# Altium schematic symbol library jlcpcb_2025_04_capacitors_extended_0603.schlib: 3668 symbols (part 6 of 20)
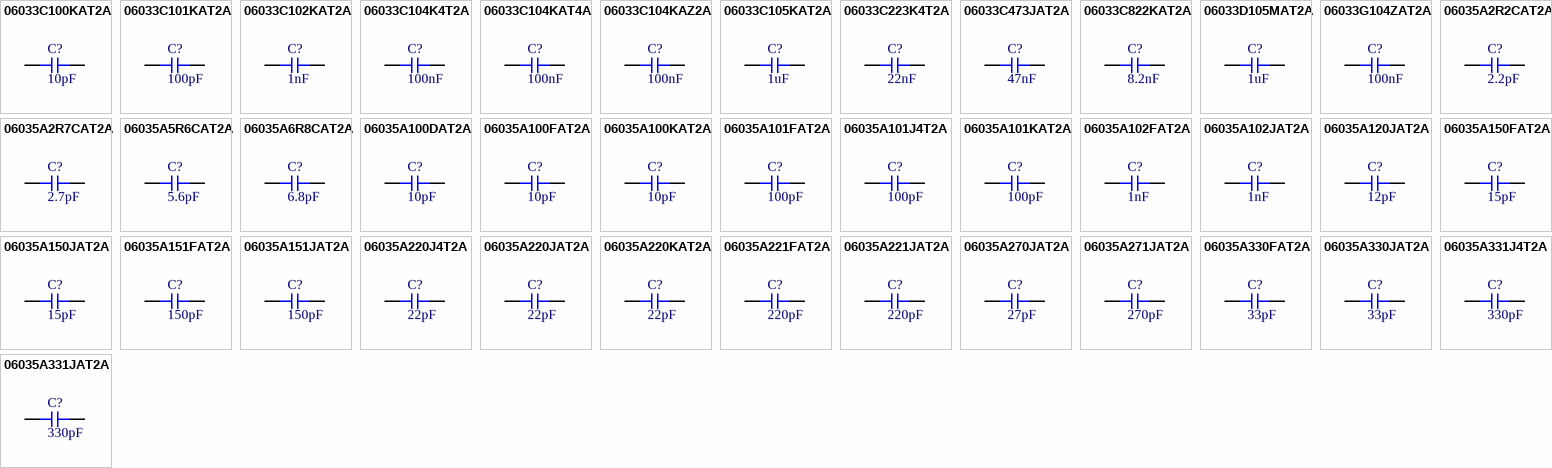
[diagram p96: symbols 06033C100KAT2A to 06035A331JAT2A]

## 06035A220JAT2A
designator C?  Capacitance: 22pF  (hidden comment: *)
Capacitor, Ceramic (MLCC), 22pF, ±5%, 50V, C0G, ±5%, SMD 0603; Manufacturer: Kyocera AVX; Manufacturer Part Number: 06035A220JAT2A; Package Size: 0603; JLCPCB Basic Part: No; JLCPCB Part Number: C2913779; Supplier 1: LCSC; Category: Capacitors - MLCC; Supplier Part Number 1: C2913779; Tolerance: ±5%; Voltage Rating: 50V; Temperature Coefficient: C0G; RoHS: Yes; ComponentLink1Description: Datasheet; ComponentLink1URL: https://wmsc.lcsc.com/wmsc/upload/file/pdf/v2/lcsc/2111191730_Kyocera-AVX-06035A220JAT2A_C2913779.pdf; ComponentLink2Description: JLCPCB Part URL; ComponentLink2URL: https://jlcpcb.com/partdetail/C2913779; ComponentLink3Description: LCSC Part URL; ComponentLink3URL: https://lcsc.com/product-detail/Multilayer-Ceramic-Capacitors-MLCC---SMD-SMT_Kyocera-AVX-Kyocera-AVX-06035A220JAT2A_C2913779.html
footprint CAP-0603 (0603 (1608M) Capacitor)
pins: 1, 2

## 06035A220KAT2A
designator C?  Capacitance: 22pF  (hidden comment: *)
Capacitor, Ceramic (MLCC), 22pF, ±10%, 50V, C0G, ±10%, SMD 0603; Manufacturer: AVX; Manufacturer Part Number: 06035A220KAT2A; Package Size: 0603; JLCPCB Basic Part: No; JLCPCB Part Number: C597147; Supplier 1: LCSC; Category: Capacitors - MLCC; Supplier Part Number 1: C597147; Tolerance: ±10%; Voltage Rating: 50V; Temperature Coefficient: C0G; RoHS: Yes; ComponentLink1Description: Datasheet; ComponentLink1URL: https://wmsc.lcsc.com/wmsc/upload/file/pdf/v2/lcsc/2304140030_Kyocera-AVX-06035A220KAT2A_C597147.pdf; ComponentLink2Description: JLCPCB Part URL; ComponentLink2URL: https://jlcpcb.com/partdetail/C597147; ComponentLink3Description: LCSC Part URL; ComponentLink3URL: https://lcsc.com/product-detail/Multilayer-Ceramic-Capacitors-MLCC---SMD-SMT_Kyocera-AVX-Kyocera-AVX-06035A220KAT2A_C597147.html
footprint CAP-0603 (0603 (1608M) Capacitor)
pins: 1, 2

## 06035A221FAT2A
designator C?  Capacitance: 220pF  (hidden comment: *)
Capacitor, Ceramic (MLCC), 220pF, ±1%, 50V, C0G, ±1%, SMD 0603; Manufacturer: AVX; Manufacturer Part Number: 06035A221FAT2A; Package Size: 0603; JLCPCB Basic Part: No; JLCPCB Part Number: C597148; Supplier 1: LCSC; Category: Capacitors - MLCC; Supplier Part Number 1: C597148; Tolerance: ±1%; Voltage Rating: 50V; Temperature Coefficient: C0G; RoHS: Yes; ComponentLink1Description: Datasheet; ComponentLink1URL: https://wmsc.lcsc.com/wmsc/upload/file/pdf/v2/lcsc/2304140030_Kyocera-AVX-06035A221FAT2A_C597148.pdf; ComponentLink2Description: JLCPCB Part URL; ComponentLink2URL: https://jlcpcb.com/partdetail/C597148; ComponentLink3Description: LCSC Part URL; ComponentLink3URL: https://lcsc.com/product-detail/Multilayer-Ceramic-Capacitors-MLCC---SMD-SMT_Kyocera-AVX-Kyocera-AVX-06035A221FAT2A_C597148.html
footprint CAP-0603 (0603 (1608M) Capacitor)
pins: 1, 2

## 06035A221JAT2A
designator C?  Capacitance: 220pF  (hidden comment: *)
Capacitor, Ceramic (MLCC), 220pF, ±5%, 50V, C0G, ±5%, SMD 0603; Manufacturer: AVX; Manufacturer Part Number: 06035A221JAT2A; Package Size: 0603; JLCPCB Basic Part: No; JLCPCB Part Number: C597151; Supplier 1: LCSC; Category: Capacitors - MLCC; Supplier Part Number 1: C597151; Tolerance: ±5%; Voltage Rating: 50V; Temperature Coefficient: C0G; RoHS: Yes; ComponentLink1Description: Datasheet; ComponentLink1URL: https://wmsc.lcsc.com/wmsc/upload/file/pdf/v2/lcsc/2304140030_Kyocera-AVX-06035A221JAT2A_C597151.pdf; ComponentLink2Description: JLCPCB Part URL; ComponentLink2URL: https://jlcpcb.com/partdetail/C597151; ComponentLink3Description: LCSC Part URL; ComponentLink3URL: https://lcsc.com/product-detail/Multilayer-Ceramic-Capacitors-MLCC---SMD-SMT_Kyocera-AVX-Kyocera-AVX-06035A221JAT2A_C597151.html
footprint CAP-0603 (0603 (1608M) Capacitor)
pins: 1, 2

## 06035A270JAT2A
designator C?  Capacitance: 27pF  (hidden comment: *)
Capacitor, Ceramic (MLCC), 27pF, ±5%, 50V, C0G, ±5%, SMD 0603; Manufacturer: AVX; Manufacturer Part Number: 06035A270JAT2A; Package Size: 0603; JLCPCB Basic Part: No; JLCPCB Part Number: C597154; Supplier 1: LCSC; Category: Capacitors - MLCC; Supplier Part Number 1: C597154; Tolerance: ±5%; Voltage Rating: 50V; Temperature Coefficient: C0G; RoHS: Yes; ComponentLink1Description: Datasheet; ComponentLink1URL: https://wmsc.lcsc.com/wmsc/upload/file/pdf/v2/lcsc/2304140030_Kyocera-AVX-06035A270JAT2A_C597154.pdf; ComponentLink2Description: JLCPCB Part URL; ComponentLink2URL: https://jlcpcb.com/partdetail/C597154; ComponentLink3Description: LCSC Part URL; ComponentLink3URL: https://lcsc.com/product-detail/Multilayer-Ceramic-Capacitors-MLCC---SMD-SMT_Kyocera-AVX-Kyocera-AVX-06035A270JAT2A_C597154.html
footprint CAP-0603 (0603 (1608M) Capacitor)
pins: 1, 2

## 06035A271JAT2A
designator C?  Capacitance: 270pF  (hidden comment: *)
Capacitor, Ceramic (MLCC), 270pF, ±5%, 50V, C0G, ±5%, SMD 0603; Manufacturer: AVX; Manufacturer Part Number: 06035A271JAT2A; Package Size: 0603; JLCPCB Basic Part: No; JLCPCB Part Number: C597155; Supplier 1: LCSC; Category: Capacitors - MLCC; Supplier Part Number 1: C597155; Tolerance: ±5%; Voltage Rating: 50V; Temperature Coefficient: C0G; RoHS: Yes; ComponentLink1Description: Datasheet; ComponentLink1URL: https://wmsc.lcsc.com/wmsc/upload/file/pdf/v2/lcsc/2304140030_Kyocera-AVX-06035A271JAT2A_C597155.pdf; ComponentLink2Description: JLCPCB Part URL; ComponentLink2URL: https://jlcpcb.com/partdetail/C597155; ComponentLink3Description: LCSC Part URL; ComponentLink3URL: https://lcsc.com/product-detail/Multilayer-Ceramic-Capacitors-MLCC---SMD-SMT_Kyocera-AVX-Kyocera-AVX-06035A271JAT2A_C597155.html
footprint CAP-0603 (0603 (1608M) Capacitor)
pins: 1, 2

## 06035A330FAT2A
designator C?  Capacitance: 33pF  (hidden comment: *)
Capacitor, Ceramic (MLCC), 33pF, ±1%, 50V, C0G, ±1%, SMD 0603; Manufacturer: AVX; Manufacturer Part Number: 06035A330FAT2A; Package Size: 0603; JLCPCB Basic Part: No; JLCPCB Part Number: C597158; Supplier 1: LCSC; Category: Capacitors - MLCC; Supplier Part Number 1: C597158; Tolerance: ±1%; Voltage Rating: 50V; Temperature Coefficient: C0G; RoHS: Yes; ComponentLink1Description: Datasheet; ComponentLink1URL: https://wmsc.lcsc.com/wmsc/upload/file/pdf/v2/lcsc/2304140030_Kyocera-AVX-06035A330FAT2A_C597158.pdf; ComponentLink2Description: JLCPCB Part URL; ComponentLink2URL: https://jlcpcb.com/partdetail/C597158; ComponentLink3Description: LCSC Part URL; ComponentLink3URL: https://lcsc.com/product-detail/Multilayer-Ceramic-Capacitors-MLCC---SMD-SMT_Kyocera-AVX-Kyocera-AVX-06035A330FAT2A_C597158.html
footprint CAP-0603 (0603 (1608M) Capacitor)
pins: 1, 2

## 06035A330JAT2A
designator C?  Capacitance: 33pF  (hidden comment: *)
Capacitor, Ceramic (MLCC), 33pF, ±5%, 50V, C0G, ±5%, SMD 0603; Manufacturer: Kyocera AVX; Manufacturer Part Number: 06035A330JAT2A; Package Size: 0603; JLCPCB Basic Part: No; JLCPCB Part Number: C2168738; Supplier 1: LCSC; Category: Capacitors - MLCC; Supplier Part Number 1: C2168738; Tolerance: ±5%; Voltage Rating: 50V; Temperature Coefficient: C0G; RoHS: Yes; ComponentLink1Description: Datasheet; ComponentLink1URL: https://wmsc.lcsc.com/wmsc/upload/file/pdf/v2/lcsc/2304140030_Kyocera-AVX-06035A330JAT2A_C2168738.pdf; ComponentLink2Description: JLCPCB Part URL; ComponentLink2URL: https://jlcpcb.com/partdetail/C2168738; ComponentLink3Description: LCSC Part URL; ComponentLink3URL: https://lcsc.com/product-detail/Multilayer-Ceramic-Capacitors-MLCC---SMD-SMT_Kyocera-AVX-Kyocera-AVX-06035A330JAT2A_C2168738.html
footprint CAP-0603 (0603 (1608M) Capacitor)
pins: 1, 2

## 06035A331J4T2A
designator C?  Capacitance: 330pF  (hidden comment: *)
Capacitor, Ceramic (MLCC), 330pF, ±5%, 50V, C0G, ±5%, SMD 0603; Manufacturer: Kyocera AVX; Manufacturer Part Number: 06035A331J4T2A; Package Size: 0603; JLCPCB Basic Part: No; JLCPCB Part Number: C779989; Supplier 1: LCSC; Category: Capacitors - MLCC; Supplier Part Number 1: C779989; Tolerance: ±5%; Voltage Rating: 50V; Temperature Coefficient: C0G; RoHS: Yes; ComponentLink1Description: Datasheet; ComponentLink1URL: https://wmsc.lcsc.com/wmsc/upload/file/pdf/v2/lcsc/2304140030_Kyocera-AVX-06035A331J4T2A_C779989.pdf; ComponentLink2Description: JLCPCB Part URL; ComponentLink2URL: https://jlcpcb.com/partdetail/C779989; ComponentLink3Description: LCSC Part URL; ComponentLink3URL: https://lcsc.com/product-detail/Multilayer-Ceramic-Capacitors-MLCC---SMD-SMT_Kyocera-AVX-Kyocera-AVX-06035A331J4T2A_C779989.html
footprint CAP-0603 (0603 (1608M) Capacitor)
pins: 1, 2

## 06035A331JAT2A
designator C?  Capacitance: 330pF  (hidden comment: *)
Capacitor, Ceramic (MLCC), 330pF, ±5%, 50V, C0G, ±5%, SMD 0603; Manufacturer: AVX; Manufacturer Part Number: 06035A331JAT2A; Package Size: 0603; JLCPCB Basic Part: No; JLCPCB Part Number: C597160; Supplier 1: LCSC; Category: Capacitors - MLCC; Supplier Part Number 1: C597160; Tolerance: ±5%; Voltage Rating: 50V; Temperature Coefficient: C0G; RoHS: Yes; ComponentLink1Description: Datasheet; ComponentLink1URL: https://wmsc.lcsc.com/wmsc/upload/file/pdf/v2/lcsc/2304140030_Kyocera-AVX-06035A331JAT2A_C597160.pdf; ComponentLink2Description: JLCPCB Part URL; ComponentLink2URL: https://jlcpcb.com/partdetail/C597160; ComponentLink3Description: LCSC Part URL; ComponentLink3URL: https://lcsc.com/product-detail/Multilayer-Ceramic-Capacitors-MLCC---SMD-SMT_Kyocera-AVX-Kyocera-AVX-06035A331JAT2A_C597160.html
footprint CAP-0603 (0603 (1608M) Capacitor)
pins: 1, 2

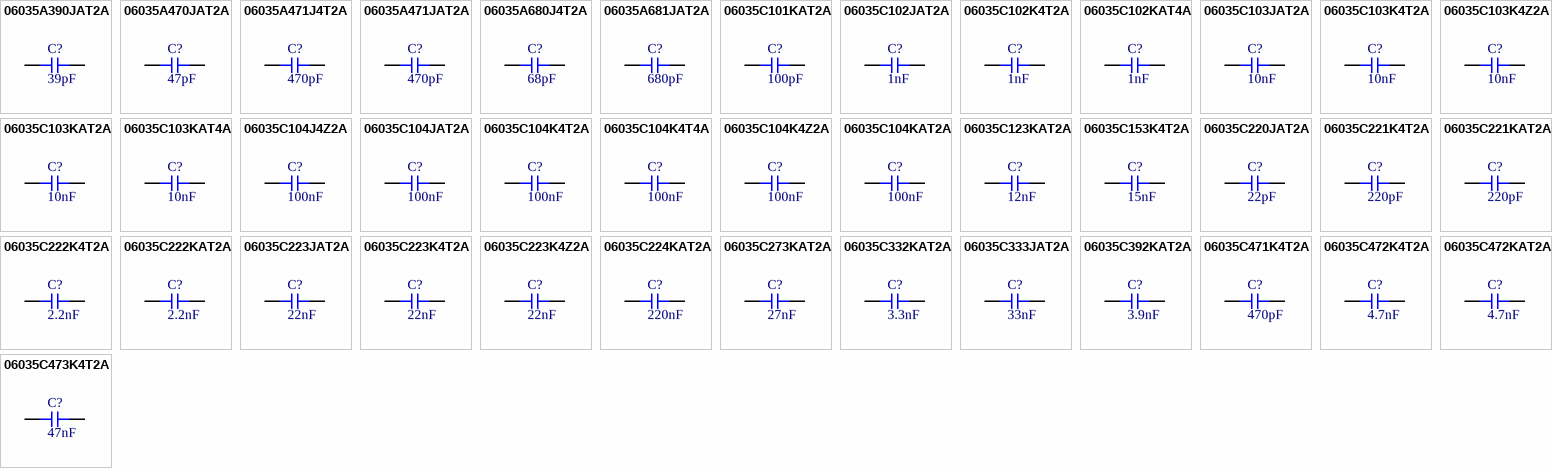
[diagram p23: symbols 06035A390JAT2A to 06035C473K4T2A]

## 06035A390JAT2A
designator C?  Capacitance: 39pF  (hidden comment: *)
Capacitor, Ceramic (MLCC), 39pF, ±5%, 50V, C0G, ±5%, SMD 0603; Manufacturer: AVX; Manufacturer Part Number: 06035A390JAT2A; Package Size: 0603; JLCPCB Basic Part: No; JLCPCB Part Number: C597161; Supplier 1: LCSC; Category: Capacitors - MLCC; Supplier Part Number 1: C597161; Tolerance: ±5%; Voltage Rating: 50V; Temperature Coefficient: C0G; RoHS: Yes; ComponentLink1Description: Datasheet; ComponentLink1URL: https://wmsc.lcsc.com/wmsc/upload/file/pdf/v2/lcsc/2304140030_Kyocera-AVX-06035A390JAT2A_C597161.pdf; ComponentLink2Description: JLCPCB Part URL; ComponentLink2URL: https://jlcpcb.com/partdetail/C597161; ComponentLink3Description: LCSC Part URL; ComponentLink3URL: https://lcsc.com/product-detail/Multilayer-Ceramic-Capacitors-MLCC---SMD-SMT_Kyocera-AVX-Kyocera-AVX-06035A390JAT2A_C597161.html
footprint CAP-0603 (0603 (1608M) Capacitor)
pins: 1, 2

## 06035A470JAT2A
designator C?  Capacitance: 47pF  (hidden comment: *)
Capacitor, Ceramic (MLCC), 47pF, ±5%, 50V, C0G, ±5%, SMD 0603; Manufacturer: AVX; Manufacturer Part Number: 06035A470JAT2A; Package Size: 0603; JLCPCB Basic Part: No; JLCPCB Part Number: C513324; Supplier 1: LCSC; Category: Capacitors - MLCC; Supplier Part Number 1: C513324; Tolerance: ±5%; Voltage Rating: 50V; Temperature Coefficient: C0G; RoHS: Yes; ComponentLink1Description: Datasheet; ComponentLink1URL: https://wmsc.lcsc.com/wmsc/upload/file/pdf/v2/lcsc/2304140030_Kyocera-AVX-06035A470JAT2A_C513324.pdf; ComponentLink2Description: JLCPCB Part URL; ComponentLink2URL: https://jlcpcb.com/partdetail/C513324; ComponentLink3Description: LCSC Part URL; ComponentLink3URL: https://lcsc.com/product-detail/Multilayer-Ceramic-Capacitors-MLCC---SMD-SMT_Kyocera-AVX-Kyocera-AVX-06035A470JAT2A_C513324.html
footprint CAP-0603 (0603 (1608M) Capacitor)
pins: 1, 2

## 06035A471J4T2A
designator C?  Capacitance: 470pF  (hidden comment: *)
Capacitor, Ceramic (MLCC), 470pF, ±5%, 50V, C0G, ±5%, SMD 0603; Manufacturer: AVX; Manufacturer Part Number: 06035A471J4T2A; Package Size: 0603; JLCPCB Basic Part: No; JLCPCB Part Number: C597167; Supplier 1: LCSC; Category: Capacitors - MLCC; Supplier Part Number 1: C597167; Tolerance: ±5%; Voltage Rating: 50V; Temperature Coefficient: C0G; RoHS: Yes; ComponentLink1Description: Datasheet; ComponentLink1URL: https://wmsc.lcsc.com/wmsc/upload/file/pdf/v2/lcsc/2304140030_Kyocera-AVX-06035A471J4T2A_C597167.pdf; ComponentLink2Description: JLCPCB Part URL; ComponentLink2URL: https://jlcpcb.com/partdetail/C597167; ComponentLink3Description: LCSC Part URL; ComponentLink3URL: https://lcsc.com/product-detail/Multilayer-Ceramic-Capacitors-MLCC---SMD-SMT_Kyocera-AVX-Kyocera-AVX-06035A471J4T2A_C597167.html
footprint CAP-0603 (0603 (1608M) Capacitor)
pins: 1, 2

## 06035A471JAT2A
designator C?  Capacitance: 470pF  (hidden comment: *)
Capacitor, Ceramic (MLCC), 470pF, ±5%, 50V, C0G, ±5%, SMD 0603; Manufacturer: AVX; Manufacturer Part Number: 06035A471JAT2A; Package Size: 0603; JLCPCB Basic Part: No; JLCPCB Part Number: C597168; Supplier 1: LCSC; Category: Capacitors - MLCC; Supplier Part Number 1: C597168; Tolerance: ±5%; Voltage Rating: 50V; Temperature Coefficient: C0G; RoHS: Yes; ComponentLink1Description: Datasheet; ComponentLink1URL: https://wmsc.lcsc.com/wmsc/upload/file/pdf/v2/lcsc/2304140030_Kyocera-AVX-06035A471JAT2A_C597168.pdf; ComponentLink2Description: JLCPCB Part URL; ComponentLink2URL: https://jlcpcb.com/partdetail/C597168; ComponentLink3Description: LCSC Part URL; ComponentLink3URL: https://lcsc.com/product-detail/Multilayer-Ceramic-Capacitors-MLCC---SMD-SMT_Kyocera-AVX-Kyocera-AVX-06035A471JAT2A_C597168.html
footprint CAP-0603 (0603 (1608M) Capacitor)
pins: 1, 2

## 06035A680J4T2A
designator C?  Capacitance: 68pF  (hidden comment: *)
Capacitor, Ceramic (MLCC), 68pF, ±5%, 50V, C0G, ±5%, SMD 0603; Manufacturer: Kyocera AVX; Manufacturer Part Number: 06035A680J4T2A; Package Size: 0603; JLCPCB Basic Part: No; JLCPCB Part Number: C779986; Supplier 1: LCSC; Category: Capacitors - MLCC; Supplier Part Number 1: C779986; Tolerance: ±5%; Voltage Rating: 50V; Temperature Coefficient: C0G; RoHS: Yes; ComponentLink1Description: Datasheet; ComponentLink1URL: https://wmsc.lcsc.com/wmsc/upload/file/pdf/v2/lcsc/2304140030_Kyocera-AVX-06035A680J4T2A_C779986.pdf; ComponentLink2Description: JLCPCB Part URL; ComponentLink2URL: https://jlcpcb.com/partdetail/C779986; ComponentLink3Description: LCSC Part URL; ComponentLink3URL: https://lcsc.com/product-detail/Multilayer-Ceramic-Capacitors-MLCC---SMD-SMT_Kyocera-AVX-Kyocera-AVX-06035A680J4T2A_C779986.html
footprint CAP-0603 (0603 (1608M) Capacitor)
pins: 1, 2

## 06035A681JAT2A
designator C?  Capacitance: 680pF  (hidden comment: *)
Capacitor, Ceramic (MLCC), 680pF, ±5%, 50V, C0G, ±5%, SMD 0603; Manufacturer: AVX; Manufacturer Part Number: 06035A681JAT2A; Package Size: 0603; JLCPCB Basic Part: No; JLCPCB Part Number: C597175; Supplier 1: LCSC; Category: Capacitors - MLCC; Supplier Part Number 1: C597175; Tolerance: ±5%; Voltage Rating: 50V; Temperature Coefficient: C0G; RoHS: Yes; ComponentLink1Description: Datasheet; ComponentLink1URL: https://wmsc.lcsc.com/wmsc/upload/file/pdf/v2/lcsc/2304140030_Kyocera-AVX-06035A681JAT2A_C597175.pdf; ComponentLink2Description: JLCPCB Part URL; ComponentLink2URL: https://jlcpcb.com/partdetail/C597175; ComponentLink3Description: LCSC Part URL; ComponentLink3URL: https://lcsc.com/product-detail/Multilayer-Ceramic-Capacitors-MLCC---SMD-SMT_Kyocera-AVX-Kyocera-AVX-06035A681JAT2A_C597175.html
footprint CAP-0603 (0603 (1608M) Capacitor)
pins: 1, 2

## 06035C101KAT2A
designator C?  Capacitance: 100pF  (hidden comment: *)
Capacitor, Ceramic (MLCC), 100pF, ±10%, 50V, X7R, ±10%, SMD 0603; Manufacturer: AVX; Manufacturer Part Number: 06035C101KAT2A; Package Size: 0603; JLCPCB Basic Part: No; JLCPCB Part Number: C597182; Supplier 1: LCSC; Category: Capacitors - MLCC; Supplier Part Number 1: C597182; Tolerance: ±10%; Voltage Rating: 50V; Temperature Coefficient: X7R; RoHS: Yes; ComponentLink1Description: Datasheet; ComponentLink1URL: https://wmsc.lcsc.com/wmsc/upload/file/pdf/v2/lcsc/2304140030_Kyocera-AVX-06035C101KAT2A_C597182.pdf; ComponentLink2Description: JLCPCB Part URL; ComponentLink2URL: https://jlcpcb.com/partdetail/C597182; ComponentLink3Description: LCSC Part URL; ComponentLink3URL: https://lcsc.com/product-detail/Multilayer-Ceramic-Capacitors-MLCC---SMD-SMT_Kyocera-AVX-Kyocera-AVX-06035C101KAT2A_C597182.html
footprint CAP-0603 (0603 (1608M) Capacitor)
pins: 1, 2

## 06035C102JAT2A
designator C?  Capacitance: 1nF  (hidden comment: *)
Capacitor, Ceramic (MLCC), 1nF, ±5%, 50V, X7R, ±5%, SMD 0603; Manufacturer: AVX; Manufacturer Part Number: 06035C102JAT2A; Package Size: 0603; JLCPCB Basic Part: No; JLCPCB Part Number: C597183; Supplier 1: LCSC; Category: Capacitors - MLCC; Supplier Part Number 1: C597183; Tolerance: ±5%; Voltage Rating: 50V; Temperature Coefficient: X7R; RoHS: Yes; ComponentLink1Description: Datasheet; ComponentLink1URL: https://wmsc.lcsc.com/wmsc/upload/file/pdf/v2/lcsc/2304140030_Kyocera-AVX-06035C102JAT2A_C597183.pdf; ComponentLink2Description: JLCPCB Part URL; ComponentLink2URL: https://jlcpcb.com/partdetail/C597183; ComponentLink3Description: LCSC Part URL; ComponentLink3URL: https://lcsc.com/product-detail/Multilayer-Ceramic-Capacitors-MLCC---SMD-SMT_Kyocera-AVX-Kyocera-AVX-06035C102JAT2A_C597183.html
footprint CAP-0603 (0603 (1608M) Capacitor)
pins: 1, 2

## 06035C102K4T2A
designator C?  Capacitance: 1nF  (hidden comment: *)
Capacitor, Ceramic (MLCC), 1nF, ±10%, 50V, X7R, ±10%, SMD 0603; Manufacturer: AVX; Manufacturer Part Number: 06035C102K4T2A; Package Size: 0603; JLCPCB Basic Part: No; JLCPCB Part Number: C779969; Supplier 1: LCSC; Category: Capacitors - MLCC; Supplier Part Number 1: C779969; Tolerance: ±10%; Voltage Rating: 50V; Temperature Coefficient: X7R; RoHS: Yes; ComponentLink1Description: Datasheet; ComponentLink1URL: https://wmsc.lcsc.com/wmsc/upload/file/pdf/v2/lcsc/2304140030_Kyocera-AVX-06035C102K4T2A_C779969.pdf; ComponentLink2Description: JLCPCB Part URL; ComponentLink2URL: https://jlcpcb.com/partdetail/C779969; ComponentLink3Description: LCSC Part URL; ComponentLink3URL: https://lcsc.com/product-detail/Multilayer-Ceramic-Capacitors-MLCC---SMD-SMT_Kyocera-AVX-Kyocera-AVX-06035C102K4T2A_C779969.html
footprint CAP-0603 (0603 (1608M) Capacitor)
pins: 1, 2

## 06035C102KAT4A
designator C?  Capacitance: 1nF  (hidden comment: *)
Capacitor, Ceramic (MLCC), 1nF, ±10%, 50V, X7R, ±10%, SMD 0603; Manufacturer: AVX; Manufacturer Part Number: 06035C102KAT4A; Package Size: 0603; JLCPCB Basic Part: No; JLCPCB Part Number: C597186; Supplier 1: LCSC; Category: Capacitors - MLCC; Supplier Part Number 1: C597186; Tolerance: ±10%; Voltage Rating: 50V; Temperature Coefficient: X7R; RoHS: Yes; ComponentLink1Description: Datasheet; ComponentLink1URL: https://wmsc.lcsc.com/wmsc/upload/file/pdf/v2/lcsc/2304140030_Kyocera-AVX-06035C102KAT4A_C597186.pdf; ComponentLink2Description: JLCPCB Part URL; ComponentLink2URL: https://jlcpcb.com/partdetail/C597186; ComponentLink3Description: LCSC Part URL; ComponentLink3URL: https://lcsc.com/product-detail/Multilayer-Ceramic-Capacitors-MLCC---SMD-SMT_Kyocera-AVX-Kyocera-AVX-06035C102KAT4A_C597186.html
footprint CAP-0603 (0603 (1608M) Capacitor)
pins: 1, 2

## 06035C103JAT2A
designator C?  Capacitance: 10nF  (hidden comment: *)
Capacitor, Ceramic (MLCC), 10nF, ±5%, 50V, X7R, ±5%, SMD 0603; Manufacturer: AVX; Manufacturer Part Number: 06035C103JAT2A; Package Size: 0603; JLCPCB Basic Part: No; JLCPCB Part Number: C597189; Supplier 1: LCSC; Category: Capacitors - MLCC; Supplier Part Number 1: C597189; Tolerance: ±5%; Voltage Rating: 50V; Temperature Coefficient: X7R; RoHS: Yes; ComponentLink1Description: Datasheet; ComponentLink1URL: https://wmsc.lcsc.com/wmsc/upload/file/pdf/v2/lcsc/2304140030_Kyocera-AVX-06035C103JAT2A_C597189.pdf; ComponentLink2Description: JLCPCB Part URL; ComponentLink2URL: https://jlcpcb.com/partdetail/C597189; ComponentLink3Description: LCSC Part URL; ComponentLink3URL: https://lcsc.com/product-detail/Multilayer-Ceramic-Capacitors-MLCC---SMD-SMT_Kyocera-AVX-Kyocera-AVX-06035C103JAT2A_C597189.html
footprint CAP-0603 (0603 (1608M) Capacitor)
pins: 1, 2

## 06035C103K4T2A
designator C?  Capacitance: 10nF  (hidden comment: *)
Capacitor, Ceramic (MLCC), 10nF, ±10%, 50V, X7R, ±10%, SMD 0603; Manufacturer: Kyocera AVX; Manufacturer Part Number: 06035C103K4T2A; Package Size: 0603; JLCPCB Basic Part: No; JLCPCB Part Number: C513325; Supplier 1: LCSC; Category: Capacitors - MLCC; Supplier Part Number 1: C513325; Tolerance: ±10%; Voltage Rating: 50V; Temperature Coefficient: X7R; RoHS: Yes; ComponentLink1Description: Datasheet; ComponentLink1URL: https://wmsc.lcsc.com/wmsc/upload/file/pdf/v2/lcsc/2304140030_Kyocera-AVX-06035C103K4T2A_C513325.pdf; ComponentLink2Description: JLCPCB Part URL; ComponentLink2URL: https://jlcpcb.com/partdetail/C513325; ComponentLink3Description: LCSC Part URL; ComponentLink3URL: https://lcsc.com/product-detail/Multilayer-Ceramic-Capacitors-MLCC---SMD-SMT_Kyocera-AVX-Kyocera-AVX-06035C103K4T2A_C513325.html
footprint CAP-0603 (0603 (1608M) Capacitor)
pins: 1, 2

## 06035C103K4Z2A
designator C?  Capacitance: 10nF  (hidden comment: *)
Capacitor, Ceramic (MLCC), 10nF, ±10%, 50V, X7R, ±10%, SMD 0603; Manufacturer: AVX; Manufacturer Part Number: 06035C103K4Z2A; Package Size: 0603; JLCPCB Basic Part: No; JLCPCB Part Number: C597191; Supplier 1: LCSC; Category: Capacitors - MLCC; Supplier Part Number 1: C597191; Tolerance: ±10%; Voltage Rating: 50V; Temperature Coefficient: X7R; RoHS: Yes; ComponentLink1Description: Datasheet; ComponentLink1URL: https://wmsc.lcsc.com/wmsc/upload/file/pdf/v2/lcsc/2304140030_Kyocera-AVX-06035C103K4Z2A_C597191.pdf; ComponentLink2Description: JLCPCB Part URL; ComponentLink2URL: https://jlcpcb.com/partdetail/C597191; ComponentLink3Description: LCSC Part URL; ComponentLink3URL: https://lcsc.com/product-detail/Multilayer-Ceramic-Capacitors-MLCC---SMD-SMT_Kyocera-AVX-Kyocera-AVX-06035C103K4Z2A_C597191.html
footprint CAP-0603 (0603 (1608M) Capacitor)
pins: 1, 2

## 06035C103KAT2A
designator C?  Capacitance: 10nF  (hidden comment: *)
Capacitor, Ceramic (MLCC), 10nF, ±10%, 50V, X7R, ±10%, SMD 0603; Manufacturer: AVX; Manufacturer Part Number: 06035C103KAT2A; Package Size: 0603; JLCPCB Basic Part: No; JLCPCB Part Number: C128913; Supplier 1: LCSC; Category: Capacitors - MLCC; Supplier Part Number 1: C128913; Tolerance: ±10%; Voltage Rating: 50V; Temperature Coefficient: X7R; RoHS: Yes; ComponentLink1Description: Datasheet; ComponentLink1URL: https://wmsc.lcsc.com/wmsc/upload/file/pdf/v2/lcsc/2304140030_Kyocera-AVX-06035C103KAT2A_C128913.pdf; ComponentLink2Description: JLCPCB Part URL; ComponentLink2URL: https://jlcpcb.com/partdetail/C128913; ComponentLink3Description: LCSC Part URL; ComponentLink3URL: https://lcsc.com/product-detail/Multilayer-Ceramic-Capacitors-MLCC---SMD-SMT_Kyocera-AVX-Kyocera-AVX-06035C103KAT2A_C128913.html
footprint CAP-0603 (0603 (1608M) Capacitor)
pins: 1, 2

## 06035C103KAT4A
designator C?  Capacitance: 10nF  (hidden comment: *)
Capacitor, Ceramic (MLCC), 10nF, ±10%, 50V, X7R, ±10%, SMD 0603; Manufacturer: AVX; Manufacturer Part Number: 06035C103KAT4A; Package Size: 0603; JLCPCB Basic Part: No; JLCPCB Part Number: C597192; Supplier 1: LCSC; Category: Capacitors - MLCC; Supplier Part Number 1: C597192; Tolerance: ±10%; Voltage Rating: 50V; Temperature Coefficient: X7R; RoHS: Yes; ComponentLink1Description: Datasheet; ComponentLink1URL: https://wmsc.lcsc.com/wmsc/upload/file/pdf/v2/lcsc/2304140030_Kyocera-AVX-06035C103KAT4A_C597192.pdf; ComponentLink2Description: JLCPCB Part URL; ComponentLink2URL: https://jlcpcb.com/partdetail/C597192; ComponentLink3Description: LCSC Part URL; ComponentLink3URL: https://lcsc.com/product-detail/Multilayer-Ceramic-Capacitors-MLCC---SMD-SMT_Kyocera-AVX-Kyocera-AVX-06035C103KAT4A_C597192.html
footprint CAP-0603 (0603 (1608M) Capacitor)
pins: 1, 2

## 06035C104J4Z2A
designator C?  Capacitance: 100nF  (hidden comment: *)
Capacitor, Ceramic (MLCC), 100nF, ±5%, 50V, X7R, ±5%, SMD 0603; Manufacturer: AVX; Manufacturer Part Number: 06035C104J4Z2A; Package Size: 0603; JLCPCB Basic Part: No; JLCPCB Part Number: C597193; Supplier 1: LCSC; Category: Capacitors - MLCC; Supplier Part Number 1: C597193; Tolerance: ±5%; Voltage Rating: 50V; Temperature Coefficient: X7R; RoHS: Yes; ComponentLink1Description: Datasheet; ComponentLink1URL: https://wmsc.lcsc.com/wmsc/upload/file/pdf/v2/lcsc/2304140030_Kyocera-AVX-06035C104J4Z2A_C597193.pdf; ComponentLink2Description: JLCPCB Part URL; ComponentLink2URL: https://jlcpcb.com/partdetail/C597193; ComponentLink3Description: LCSC Part URL; ComponentLink3URL: https://lcsc.com/product-detail/Multilayer-Ceramic-Capacitors-MLCC---SMD-SMT_Kyocera-AVX-Kyocera-AVX-06035C104J4Z2A_C597193.html
footprint CAP-0603 (0603 (1608M) Capacitor)
pins: 1, 2

## 06035C104JAT2A
designator C?  Capacitance: 100nF  (hidden comment: *)
Capacitor, Ceramic (MLCC), 100nF, ±5%, 50V, X7R, ±5%, SMD 0603; Manufacturer: Kyocera AVX; Manufacturer Part Number: 06035C104JAT2A; Package Size: 0603; JLCPCB Basic Part: No; JLCPCB Part Number: C129176; Supplier 1: LCSC; Category: Capacitors - MLCC; Supplier Part Number 1: C129176; Tolerance: ±5%; Voltage Rating: 50V; Temperature Coefficient: X7R; RoHS: Yes; ComponentLink1Description: Datasheet; ComponentLink1URL: https://wmsc.lcsc.com/wmsc/upload/file/pdf/v2/lcsc/2304140030_Kyocera-AVX-06035C104JAT2A_C129176.pdf; ComponentLink2Description: JLCPCB Part URL; ComponentLink2URL: https://jlcpcb.com/partdetail/C129176; ComponentLink3Description: LCSC Part URL; ComponentLink3URL: https://lcsc.com/product-detail/Multilayer-Ceramic-Capacitors-MLCC---SMD-SMT_Kyocera-AVX-Kyocera-AVX-06035C104JAT2A_C129176.html
footprint CAP-0603 (0603 (1608M) Capacitor)
pins: 1, 2

## 06035C104K4T2A
designator C?  Capacitance: 100nF  (hidden comment: *)
Capacitor, Ceramic (MLCC), 100nF, ±10%, 50V, X7R, ±10%, SMD 0603; Manufacturer: Kyocera AVX; Manufacturer Part Number: 06035C104K4T2A; Package Size: 0603; JLCPCB Basic Part: No; JLCPCB Part Number: C2168880; Supplier 1: LCSC; Category: Capacitors - MLCC; Supplier Part Number 1: C2168880; Tolerance: ±10%; Voltage Rating: 50V; Temperature Coefficient: X7R; RoHS: Yes; ComponentLink1Description: Datasheet; ComponentLink1URL: https://wmsc.lcsc.com/wmsc/upload/file/pdf/v2/lcsc/2304140030_Kyocera-AVX-06035C104K4T2A_C2168880.pdf; ComponentLink2Description: JLCPCB Part URL; ComponentLink2URL: https://jlcpcb.com/partdetail/C2168880; ComponentLink3Description: LCSC Part URL; ComponentLink3URL: https://lcsc.com/product-detail/Multilayer-Ceramic-Capacitors-MLCC---SMD-SMT_Kyocera-AVX-Kyocera-AVX-06035C104K4T2A_C2168880.html
footprint CAP-0603 (0603 (1608M) Capacitor)
pins: 1, 2

## 06035C104K4T4A
designator C?  Capacitance: 100nF  (hidden comment: *)
Capacitor, Ceramic (MLCC), 100nF, ±10%, 50V, X7R, ±10%, SMD 0603; Manufacturer: Kyocera AVX; Manufacturer Part Number: 06035C104K4T4A; Package Size: 0603; JLCPCB Basic Part: No; JLCPCB Part Number: C2171599; Supplier 1: LCSC; Category: Capacitors - MLCC; Supplier Part Number 1: C2171599; Tolerance: ±10%; Voltage Rating: 50V; Temperature Coefficient: X7R; RoHS: Yes; ComponentLink1Description: Datasheet; ComponentLink1URL: https://wmsc.lcsc.com/wmsc/upload/file/pdf/v2/lcsc/2304140030_Kyocera-AVX-06035C104K4T4A_C2171599.pdf; ComponentLink2Description: JLCPCB Part URL; ComponentLink2URL: https://jlcpcb.com/partdetail/C2171599; ComponentLink3Description: LCSC Part URL; ComponentLink3URL: https://lcsc.com/product-detail/Multilayer-Ceramic-Capacitors-MLCC---SMD-SMT_Kyocera-AVX-Kyocera-AVX-06035C104K4T4A_C2171599.html
footprint CAP-0603 (0603 (1608M) Capacitor)
pins: 1, 2

## 06035C104K4Z2A
designator C?  Capacitance: 100nF  (hidden comment: *)
Capacitor, Ceramic (MLCC), 100nF, ±10%, 50V, X7R, ±10%, SMD 0603; Manufacturer: AVX; Manufacturer Part Number: 06035C104K4Z2A; Package Size: 0603; JLCPCB Basic Part: No; JLCPCB Part Number: C597194; Supplier 1: LCSC; Category: Capacitors - MLCC; Supplier Part Number 1: C597194; Tolerance: ±10%; Voltage Rating: 50V; Temperature Coefficient: X7R; RoHS: Yes; ComponentLink1Description: Datasheet; ComponentLink1URL: https://wmsc.lcsc.com/wmsc/upload/file/pdf/v2/lcsc/2304140030_Kyocera-AVX-06035C104K4Z2A_C597194.pdf; ComponentLink2Description: JLCPCB Part URL; ComponentLink2URL: https://jlcpcb.com/partdetail/C597194; ComponentLink3Description: LCSC Part URL; ComponentLink3URL: https://lcsc.com/product-detail/Multilayer-Ceramic-Capacitors-MLCC---SMD-SMT_Kyocera-AVX-Kyocera-AVX-06035C104K4Z2A_C597194.html
footprint CAP-0603 (0603 (1608M) Capacitor)
pins: 1, 2

## 06035C104KAT2A
designator C?  Capacitance: 100nF  (hidden comment: *)
Capacitor, Ceramic (MLCC), 100nF, ±10%, 50V, X7R, ±10%, SMD 0603; Manufacturer: AVX; Manufacturer Part Number: 06035C104KAT2A; Package Size: 0603; JLCPCB Basic Part: No; JLCPCB Part Number: C88476; Supplier 1: LCSC; Category: Capacitors - MLCC; Supplier Part Number 1: C88476; Tolerance: ±10%; Voltage Rating: 50V; Temperature Coefficient: X7R; RoHS: Yes; ComponentLink1Description: Datasheet; ComponentLink1URL: https://wmsc.lcsc.com/wmsc/upload/file/pdf/v2/lcsc/1811031511_Kyocera-AVX-06035C104KAT2A_C88476.pdf; ComponentLink2Description: JLCPCB Part URL; ComponentLink2URL: https://jlcpcb.com/partdetail/C88476; ComponentLink3Description: LCSC Part URL; ComponentLink3URL: https://lcsc.com/product-detail/Multilayer-Ceramic-Capacitors-MLCC---SMD-SMT_Kyocera-AVX-Kyocera-AVX-06035C104KAT2A_C88476.html
footprint CAP-0603 (0603 (1608M) Capacitor)
pins: 1, 2

## 06035C123KAT2A
designator C?  Capacitance: 12nF  (hidden comment: *)
Capacitor, Ceramic (MLCC), 12nF, ±10%, 50V, X7R, ±10%, SMD 0603; Manufacturer: Kyocera AVX; Manufacturer Part Number: 06035C123KAT2A; Package Size: 0603; JLCPCB Basic Part: No; JLCPCB Part Number: C2169366; Supplier 1: LCSC; Category: Capacitors - MLCC; Supplier Part Number 1: C2169366; Tolerance: ±10%; Voltage Rating: 50V; Temperature Coefficient: X7R; RoHS: Yes; ComponentLink1Description: Datasheet; ComponentLink1URL: https://wmsc.lcsc.com/wmsc/upload/file/pdf/v2/lcsc/2304140030_Kyocera-AVX-06035C123KAT2A_C2169366.pdf; ComponentLink2Description: JLCPCB Part URL; ComponentLink2URL: https://jlcpcb.com/partdetail/C2169366; ComponentLink3Description: LCSC Part URL; ComponentLink3URL: https://lcsc.com/product-detail/Multilayer-Ceramic-Capacitors-MLCC---SMD-SMT_Kyocera-AVX-Kyocera-AVX-06035C123KAT2A_C2169366.html
footprint CAP-0603 (0603 (1608M) Capacitor)
pins: 1, 2

## 06035C153K4T2A
designator C?  Capacitance: 15nF  (hidden comment: *)
Capacitor, Ceramic (MLCC), 15nF, ±10%, 50V, X7R, ±10%, SMD 0603; Manufacturer: Kyocera AVX; Manufacturer Part Number: 06035C153K4T2A; Package Size: 0603; JLCPCB Basic Part: No; JLCPCB Part Number: C779981; Supplier 1: LCSC; Category: Capacitors - MLCC; Supplier Part Number 1: C779981; Tolerance: ±10%; Voltage Rating: 50V; Temperature Coefficient: X7R; RoHS: Yes; ComponentLink1Description: Datasheet; ComponentLink1URL: https://wmsc.lcsc.com/wmsc/upload/file/pdf/v2/lcsc/2304140030_Kyocera-AVX-06035C153K4T2A_C779981.pdf; ComponentLink2Description: JLCPCB Part URL; ComponentLink2URL: https://jlcpcb.com/partdetail/C779981; ComponentLink3Description: LCSC Part URL; ComponentLink3URL: https://lcsc.com/product-detail/Multilayer-Ceramic-Capacitors-MLCC---SMD-SMT_Kyocera-AVX-Kyocera-AVX-06035C153K4T2A_C779981.html
footprint CAP-0603 (0603 (1608M) Capacitor)
pins: 1, 2

## 06035C220JAT2A
designator C?  Capacitance: 22pF  (hidden comment: *)
Capacitor, Ceramic (MLCC), 22pF, ±5%, 50V, X7R, ±5%, SMD 0603; Manufacturer: Kyocera AVX; Manufacturer Part Number: 06035C220JAT2A; Package Size: 0603; JLCPCB Basic Part: No; JLCPCB Part Number: C597198; Supplier 1: LCSC; Category: Capacitors - MLCC; Supplier Part Number 1: C597198; Tolerance: ±5%; Voltage Rating: 50V; Temperature Coefficient: X7R; RoHS: Yes; ComponentLink1Description: Datasheet; ComponentLink1URL: https://wmsc.lcsc.com/wmsc/upload/file/pdf/v2/lcsc/2309150954_Kyocera-AVX-06035C220JAT2A_C597198.pdf; ComponentLink2Description: JLCPCB Part URL; ComponentLink2URL: https://jlcpcb.com/partdetail/C597198; ComponentLink3Description: LCSC Part URL; ComponentLink3URL: https://lcsc.com/product-detail/Multilayer-Ceramic-Capacitors-MLCC---SMD-SMT_Kyocera-AVX-Kyocera-AVX-06035C220JAT2A_C597198.html
footprint CAP-0603 (0603 (1608M) Capacitor)
pins: 1, 2

## 06035C221K4T2A
designator C?  Capacitance: 220pF  (hidden comment: *)
Capacitor, Ceramic (MLCC), 220pF, ±10%, 50V, X7R, ±10%, SMD 0603; Manufacturer: Kyocera AVX; Manufacturer Part Number: 06035C221K4T2A; Package Size: 0603; JLCPCB Basic Part: No; JLCPCB Part Number: C597199; Supplier 1: LCSC; Category: Capacitors - MLCC; Supplier Part Number 1: C597199; Tolerance: ±10%; Voltage Rating: 50V; Temperature Coefficient: X7R; RoHS: Yes; ComponentLink1Description: Datasheet; ComponentLink1URL: https://wmsc.lcsc.com/wmsc/upload/file/pdf/v2/lcsc/2309151023_Kyocera-AVX-06035C221K4T2A_C597199.pdf; ComponentLink2Description: JLCPCB Part URL; ComponentLink2URL: https://jlcpcb.com/partdetail/C597199; ComponentLink3Description: LCSC Part URL; ComponentLink3URL: https://lcsc.com/product-detail/Multilayer-Ceramic-Capacitors-MLCC---SMD-SMT_Kyocera-AVX-Kyocera-AVX-06035C221K4T2A_C597199.html
footprint CAP-0603 (0603 (1608M) Capacitor)
pins: 1, 2

## 06035C221KAT2A
designator C?  Capacitance: 220pF  (hidden comment: *)
Capacitor, Ceramic (MLCC), 220pF, ±10%, 50V, X7R, ±10%, SMD 0603; Manufacturer: AVX; Manufacturer Part Number: 06035C221KAT2A; Package Size: 0603; JLCPCB Basic Part: No; JLCPCB Part Number: C513326; Supplier 1: LCSC; Category: Capacitors - MLCC; Supplier Part Number 1: C513326; Tolerance: ±10%; Voltage Rating: 50V; Temperature Coefficient: X7R; RoHS: Yes; ComponentLink1Description: Datasheet; ComponentLink1URL: https://wmsc.lcsc.com/wmsc/upload/file/pdf/v2/lcsc/2304140030_Kyocera-AVX-06035C221KAT2A_C513326.pdf; ComponentLink2Description: JLCPCB Part URL; ComponentLink2URL: https://jlcpcb.com/partdetail/C513326; ComponentLink3Description: LCSC Part URL; ComponentLink3URL: https://lcsc.com/product-detail/Multilayer-Ceramic-Capacitors-MLCC---SMD-SMT_Kyocera-AVX-Kyocera-AVX-06035C221KAT2A_C513326.html
footprint CAP-0603 (0603 (1608M) Capacitor)
pins: 1, 2

## 06035C222K4T2A
designator C?  Capacitance: 2.2nF  (hidden comment: *)
Capacitor, Ceramic (MLCC), 2.2nF, ±10%, 50V, X7R, ±10%, SMD 0603; Manufacturer: Kyocera AVX; Manufacturer Part Number: 06035C222K4T2A; Package Size: 0603; JLCPCB Basic Part: No; JLCPCB Part Number: C779970; Supplier 1: LCSC; Category: Capacitors - MLCC; Supplier Part Number 1: C779970; Tolerance: ±10%; Voltage Rating: 50V; Temperature Coefficient: X7R; RoHS: Yes; ComponentLink1Description: Datasheet; ComponentLink1URL: https://wmsc.lcsc.com/wmsc/upload/file/pdf/v2/lcsc/2304140030_Kyocera-AVX-06035C222K4T2A_C779970.pdf; ComponentLink2Description: JLCPCB Part URL; ComponentLink2URL: https://jlcpcb.com/partdetail/C779970; ComponentLink3Description: LCSC Part URL; ComponentLink3URL: https://lcsc.com/product-detail/Multilayer-Ceramic-Capacitors-MLCC---SMD-SMT_Kyocera-AVX-Kyocera-AVX-06035C222K4T2A_C779970.html
footprint CAP-0603 (0603 (1608M) Capacitor)
pins: 1, 2

## 06035C222KAT2A
designator C?  Capacitance: 2.2nF  (hidden comment: *)
Capacitor, Ceramic (MLCC), 2.2nF, ±10%, 50V, X7R, ±10%, SMD 0603; Manufacturer: Kyocera AVX; Manufacturer Part Number: 06035C222KAT2A; Package Size: 0603; JLCPCB Basic Part: No; JLCPCB Part Number: C597202; Supplier 1: LCSC; Category: Capacitors - MLCC; Supplier Part Number 1: C597202; Tolerance: ±10%; Voltage Rating: 50V; Temperature Coefficient: X7R; RoHS: Yes; ComponentLink1Description: Datasheet; ComponentLink1URL: https://wmsc.lcsc.com/wmsc/upload/file/pdf/v2/lcsc/2309150954_Kyocera-AVX-06035C222KAT2A_C597202.pdf; ComponentLink2Description: JLCPCB Part URL; ComponentLink2URL: https://jlcpcb.com/partdetail/C597202; ComponentLink3Description: LCSC Part URL; ComponentLink3URL: https://lcsc.com/product-detail/Multilayer-Ceramic-Capacitors-MLCC---SMD-SMT_Kyocera-AVX-Kyocera-AVX-06035C222KAT2A_C597202.html
footprint CAP-0603 (0603 (1608M) Capacitor)
pins: 1, 2

## 06035C223JAT2A
designator C?  Capacitance: 22nF  (hidden comment: *)
Capacitor, Ceramic (MLCC), 22nF, ±5%, 50V, X7R, ±5%, SMD 0603; Manufacturer: Kyocera AVX; Manufacturer Part Number: 06035C223JAT2A; Package Size: 0603; JLCPCB Basic Part: No; JLCPCB Part Number: C2167364; Supplier 1: LCSC; Category: Capacitors - MLCC; Supplier Part Number 1: C2167364; Tolerance: ±5%; Voltage Rating: 50V; Temperature Coefficient: X7R; RoHS: Yes; ComponentLink1Description: Datasheet; ComponentLink1URL: https://wmsc.lcsc.com/wmsc/upload/file/pdf/v2/lcsc/2304140030_Kyocera-AVX-06035C223JAT2A_C2167364.pdf; ComponentLink2Description: JLCPCB Part URL; ComponentLink2URL: https://jlcpcb.com/partdetail/C2167364; ComponentLink3Description: LCSC Part URL; ComponentLink3URL: https://lcsc.com/product-detail/Multilayer-Ceramic-Capacitors-MLCC---SMD-SMT_Kyocera-AVX-Kyocera-AVX-06035C223JAT2A_C2167364.html
footprint CAP-0603 (0603 (1608M) Capacitor)
pins: 1, 2

## 06035C223K4T2A
designator C?  Capacitance: 22nF  (hidden comment: *)
Capacitor, Ceramic (MLCC), 22nF, ±10%, 50V, X7R, ±10%, SMD 0603; Manufacturer: Kyocera AVX; Manufacturer Part Number: 06035C223K4T2A; Package Size: 0603; JLCPCB Basic Part: No; JLCPCB Part Number: C779972; Supplier 1: LCSC; Category: Capacitors - MLCC; Supplier Part Number 1: C779972; Tolerance: ±10%; Voltage Rating: 50V; Temperature Coefficient: X7R; RoHS: Yes; ComponentLink1Description: Datasheet; ComponentLink1URL: https://wmsc.lcsc.com/wmsc/upload/file/pdf/v2/lcsc/2304140030_Kyocera-AVX-06035C223K4T2A_C779972.pdf; ComponentLink2Description: JLCPCB Part URL; ComponentLink2URL: https://jlcpcb.com/partdetail/C779972; ComponentLink3Description: LCSC Part URL; ComponentLink3URL: https://lcsc.com/product-detail/Multilayer-Ceramic-Capacitors-MLCC---SMD-SMT_Kyocera-AVX-Kyocera-AVX-06035C223K4T2A_C779972.html
footprint CAP-0603 (0603 (1608M) Capacitor)
pins: 1, 2

## 06035C223K4Z2A
designator C?  Capacitance: 22nF  (hidden comment: *)
Capacitor, Ceramic (MLCC), 22nF, ±10%, 50V, X7R, ±10%, SMD 0603; Manufacturer: Kyocera AVX; Manufacturer Part Number: 06035C223K4Z2A; Package Size: 0603; JLCPCB Basic Part: No; JLCPCB Part Number: C597204; Supplier 1: LCSC; Category: Capacitors - MLCC; Supplier Part Number 1: C597204; Tolerance: ±10%; Voltage Rating: 50V; Temperature Coefficient: X7R; RoHS: Yes; ComponentLink1Description: Datasheet; ComponentLink1URL: https://wmsc.lcsc.com/wmsc/upload/file/pdf/v2/lcsc/2309151023_Kyocera-AVX-06035C223K4Z2A_C597204.pdf; ComponentLink2Description: JLCPCB Part URL; ComponentLink2URL: https://jlcpcb.com/partdetail/C597204; ComponentLink3Description: LCSC Part URL; ComponentLink3URL: https://lcsc.com/product-detail/Multilayer-Ceramic-Capacitors-MLCC---SMD-SMT_Kyocera-AVX-Kyocera-AVX-06035C223K4Z2A_C597204.html
footprint CAP-0603 (0603 (1608M) Capacitor)
pins: 1, 2

## 06035C224KAT2A
designator C?  Capacitance: 220nF  (hidden comment: *)
Capacitor, Ceramic (MLCC), 220nF, ±10%, 50V, X7R, ±10%, SMD 0603; Manufacturer: Kyocera AVX; Manufacturer Part Number: 06035C224KAT2A; Package Size: 0603; JLCPCB Basic Part: No; JLCPCB Part Number: C2167771; Supplier 1: LCSC; Category: Capacitors - MLCC; Supplier Part Number 1: C2167771; Tolerance: ±10%; Voltage Rating: 50V; Temperature Coefficient: X7R; RoHS: Yes; ComponentLink1Description: Datasheet; ComponentLink1URL: https://wmsc.lcsc.com/wmsc/upload/file/pdf/v2/lcsc/2304140030_Kyocera-AVX-06035C224KAT2A_C2167771.pdf; ComponentLink2Description: JLCPCB Part URL; ComponentLink2URL: https://jlcpcb.com/partdetail/C2167771; ComponentLink3Description: LCSC Part URL; ComponentLink3URL: https://lcsc.com/product-detail/Multilayer-Ceramic-Capacitors-MLCC---SMD-SMT_Kyocera-AVX-Kyocera-AVX-06035C224KAT2A_C2167771.html
footprint CAP-0603 (0603 (1608M) Capacitor)
pins: 1, 2

## 06035C273KAT2A
designator C?  Capacitance: 27nF  (hidden comment: *)
Capacitor, Ceramic (MLCC), 27nF, ±10%, 50V, X7R, ±10%, SMD 0603; Manufacturer: Kyocera AVX; Manufacturer Part Number: 06035C273KAT2A; Package Size: 0603; JLCPCB Basic Part: No; JLCPCB Part Number: C597206; Supplier 1: LCSC; Category: Capacitors - MLCC; Supplier Part Number 1: C597206; Tolerance: ±10%; Voltage Rating: 50V; Temperature Coefficient: X7R; RoHS: Yes; ComponentLink1Description: Datasheet; ComponentLink1URL: https://wmsc.lcsc.com/wmsc/upload/file/pdf/v2/lcsc/2309150954_Kyocera-AVX-06035C273KAT2A_C597206.pdf; ComponentLink2Description: JLCPCB Part URL; ComponentLink2URL: https://jlcpcb.com/partdetail/C597206; ComponentLink3Description: LCSC Part URL; ComponentLink3URL: https://lcsc.com/product-detail/Multilayer-Ceramic-Capacitors-MLCC---SMD-SMT_Kyocera-AVX-Kyocera-AVX-06035C273KAT2A_C597206.html
footprint CAP-0603 (0603 (1608M) Capacitor)
pins: 1, 2

## 06035C332KAT2A
designator C?  Capacitance: 3.3nF  (hidden comment: *)
Capacitor, Ceramic (MLCC), 3.3nF, ±10%, 50V, X7R, ±10%, SMD 0603; Manufacturer: Kyocera AVX; Manufacturer Part Number: 06035C332KAT2A; Package Size: 0603; JLCPCB Basic Part: No; JLCPCB Part Number: C597209; Supplier 1: LCSC; Category: Capacitors - MLCC; Supplier Part Number 1: C597209; Tolerance: ±10%; Voltage Rating: 50V; Temperature Coefficient: X7R; RoHS: Yes; ComponentLink1Description: Datasheet; ComponentLink1URL: https://wmsc.lcsc.com/wmsc/upload/file/pdf/v2/lcsc/2309150954_Kyocera-AVX-06035C332KAT2A_C597209.pdf; ComponentLink2Description: JLCPCB Part URL; ComponentLink2URL: https://jlcpcb.com/partdetail/C597209; ComponentLink3Description: LCSC Part URL; ComponentLink3URL: https://lcsc.com/product-detail/Multilayer-Ceramic-Capacitors-MLCC---SMD-SMT_Kyocera-AVX-Kyocera-AVX-06035C332KAT2A_C597209.html
footprint CAP-0603 (0603 (1608M) Capacitor)
pins: 1, 2
